# Altium schematic symbol library Electronic Devices_LIB.SchLib: 703 symbols (part 1 of 8)
Pins are listed as number, name and electrical type; pins without a type are passive.

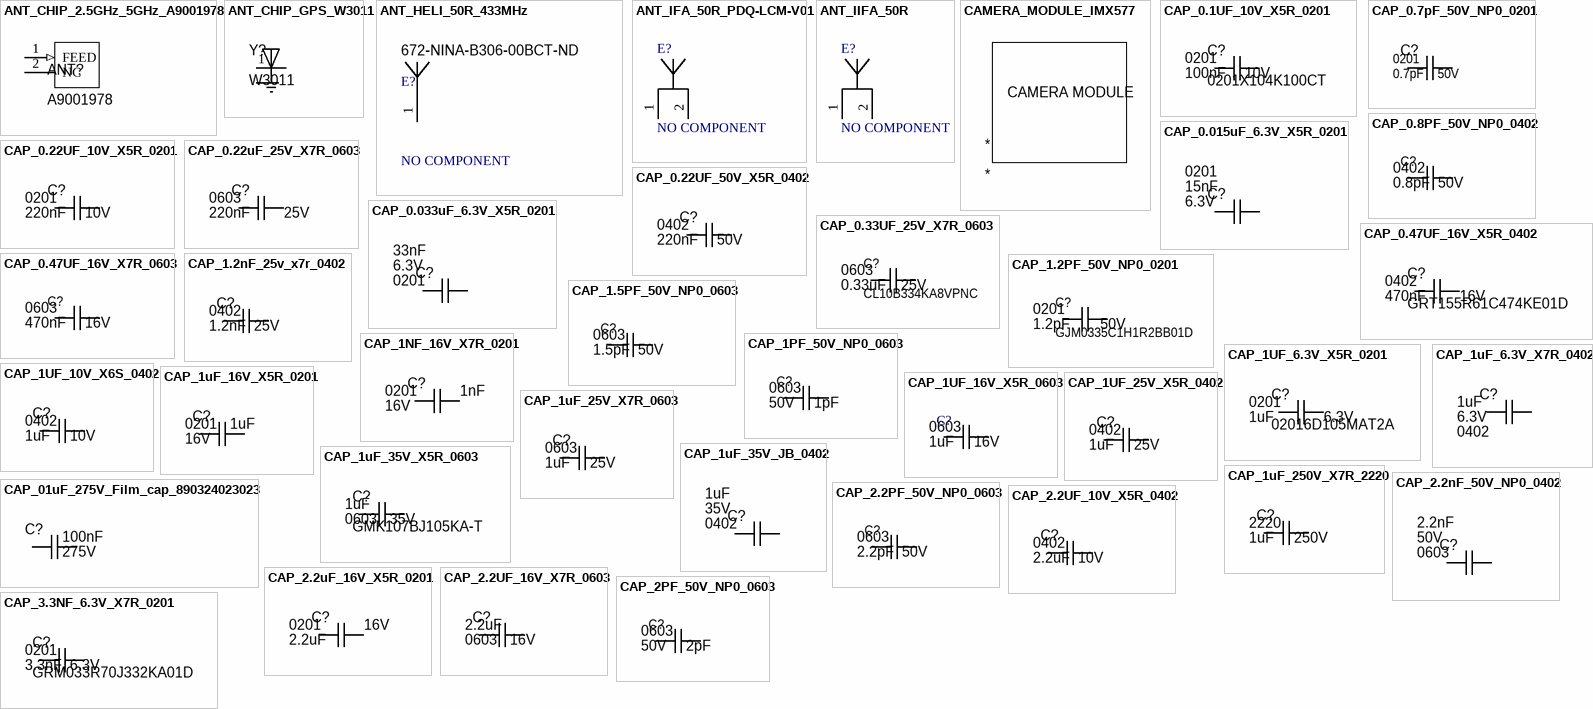
[diagram p0: symbols ANT_CHIP_2.5GHz_5GHz_A9001978 to CAP_3.3NF_6.3V_X7R_0201]

## ANT_CHIP_2.5GHz_5GHz_A9001978
designator ANT?, comment A9001978
Automotive Ultra-small Uwb Or Bl; Manufacturer: Kyocera AVX; Supplier 1: Digikey; Manufacturer Part Number: A9001978; RoHS: No; Category: Uncategorized; Stock 1: 3990; Pricing 1: 1=1.53, 10=1.367, 25=1.2976, 100=1.066, 250=0.99652, 500=0.88064, 1000=0.69525, 2500=0.6489 (USD); Supplier Part Number 1: 478-A9001978CT-ND
footprint ANTENNA_CHIP_ANTC1006X50N (1x0.55 mm)
pins: 1 FEED (in), 2 NC

## ANT_CHIP_GPS_W3011
designator Y?, comment W3011
Antenna Ceramic 3.4dB Gain 1585.42MHz 2-Pin CSMD; Manufacturer: Pulse; Frequency: 1.57542GHz; Impedance: 50R; Number of Bands: 1; Return Loss: -12dB; Max Frequency: 1.58542GHz; Min Frequency: 1.56542GHz; Supplier 1: Digikey; Manufacturer Part Number: W3011; RoHS: Yes; Category: RF Antennas; Stock 1: 8689; Pricing 1: 1=2.56, 10=1.654, 25=1.4148, 100=1.1461, 250=1.01512, 500=0.93512, 1000=0.86859 (USD); Mount: Surface Mount,PCB; Packaging: Cut Tape; Package Quantity: 3000; Termination: Solder; Series: -; Height: 0.043inch; RoHS Compliant: Yes; Lead Free: Lead Free; ComponentLink1URL: https://datasheet.ciiva.com/2792/+w3011-w3011a-2792615.pdf?src-supplier=Digikey; ComponentLink1Description: https://datasheet.ciiva.com/2792/+w3011-w3011a-2792615.pdf?src-supplier=Digikey; ComponentLink2URL: https://datasheet.ciiva.com/8152/+w3011-w3011a-8152997.pdf?src-supplier=Avnet; ComponentLink2Description: https://datasheet.ciiva.com/8152/+w3011-w3011a-8152997.pdf?src-supplier=Avnet; Supplier Part Number 1: 553-2582-1-ND
footprint ANTENNA_CHIP_XDCR_W3011
pins: 1 FEED, 2 GND (power), 2 NC, 3 GND

## ANT_HELI_50R_433MHz
designator E?, comment NO COMPONENT  Supplier Part Number 4: 672-NINA-B306-00BCT-ND  (net tie, no BOM)
433MHz Alarms, ISM, Remote Control, Security Systems Helical RF Antenna 418MHz ~ 458MHz 1.9dBi Solder Through Hole ( / ANT-433-HETH); PartNumber: ANTENNA_IIFA; SymbolCreator: Altium; SymbolVersion: 2014-08-20; Manufacturer: N/A; CompType: Antenna; MountType: N/A; ComponentLink1Description: Datasheet Link; ComponentLink1URL: http://www.ti.com/lit/an/swra117d/swra117d.pdf; PackageReference: PCB Antenna, 2-Leads; Publisher: Texas Instruments; LatestRevisionDate: 2015-03-27; Supplier 4: Digikey
footprint ANTENNA_HELICOIDAL-MICRO-TRACE_433MHz (Micro Helical Trace Antenna, 433MHz, Must have matching network to achieve 50R)
pins: 1 FEED

## ANT_IFA_50R_PDQ-LCM-V01
designator E?, comment NO COMPONENT  (net tie, no BOM)
PCB Antenna, IFA, 50R, PDQ Spirit LCM, v01, There is nothing to buy or mount.; PartNumber: ANTENNA_IIFA; SymbolCreator: Altium; SymbolVersion: 2014-08-20; Manufacturer: N/A; CompType: Antenna; MountType: N/A; ComponentLink1Description: Datasheet Link; ComponentLink1URL: http://www.ti.com/lit/an/swra117d/swra117d.pdf; PackageReference: PCB Antenna, 2-Leads; Publisher: Texas Instruments; LatestRevisionDate: 2015-03-27
footprint ANTENNA_IFA_EXPOSED_PDQ-LCM-V01 (Straight IFA, exposed Cu, PDQ Spirit LCM, v01)
footprint ANTENNA_IFA_180_EXPOSED_PDQ-LCM-V01 (Straight IFA, exposed Cu, PDQ Spirit LCM, v01, Flipped 180 deg)
pins: 1 FEED, 2 GND

## ANT_IIFA_50R
designator E?, comment NO COMPONENT  (net tie, no BOM)
PCB Antenna, IIFA, 50R, There is nothing to buy or mount.; PartNumber: ANTENNA_IIFA; SymbolCreator: Altium; SymbolVersion: 2014-08-20; Manufacturer: N/A; CompType: Antenna; MountType: N/A; ComponentLink1Description: Datasheet Link; ComponentLink1URL: http://www.ti.com/lit/an/swra117d/swra117d.pdf; PackageReference: PCB Antenna, 2-Leads; Publisher: Texas Instruments; LatestRevisionDate: 2015-03-27
footprint ANTENNA_IIFA
footprint ANTENNA_IIFA_180 (IIFA Antenna mirrored 180 degrees)
footprint ANTENNA_IIFA_180_EXPOSED (IIFA Antenna mirrored 180 degrees)
footprint ANTENNA_IIFA_EXPOSED
footprint ANTENNA_IIFA_TEST
pins: 1, 2

## CAMERA_MODULE_IMX577
designator *

## CAP_0.1UF_10V_X5R_0201
designator C?, comment 0201X104K100CT  Capacitance: 100nF  Voltage Rating: 10V  Case/Package: 0201
0201 0.1 uF 10 V ±10 %Tolerance X5R Surface Mount Multilayer Ceramic Capacitor; Manufacturer: Walsin Technologies; Tolerance: 10%; Dielectric: 1537DielectricType; Supplier 1: Digi-Key; Manufacturer Part Number: 0201X104K100CT; RoHS: Yes; Category: Ceramic Capacitors; Stock 1: 1142023; Pricing 1: 1=0.1, 10=0.028, 50=0.0164, 100=0.0127, 500=0.00954, 1000=0.0075, 2500=0.00682, 5000=0.00627 (USD); Mount: Surface Mount; Case Code (Imperial): 0201; Case Code (Metric): 0603; Min Operating Temperature: -55°C; Max Operating Temperature: 85°C; Packaging: Cut Tape; Series: -; Voltage Rating (DC): 10V; RoHS Compliant: Yes; Lead Free: 5697LeadFree; ComponentLink1URL: http://www.passivecomponent.com/indexsea/0201X104K100CT-IL.pdf?src-supplier=Digi-Key; ComponentLink1Description: http://www.passivecomponent.com/indexsea/0201X104K100CT-IL.pdf?src-supplier=Digi-Key; ComponentLink2URL: http://www.passivecomponent.com/wp-content/uploads/2018/10/MLCC.pdf?src-supplier=Digi-Key; ComponentLink2Description: http://www.passivecomponent.com/wp-content/uploads/2018/10/MLCC.pdf?src-supplier=Digi-Key; ComponentLink3URL: http://datasheet.octopart.com/0201X104K100CT-Walsin-Technologies-datasheet-136037192.pdf?src-supplier=Rs; ComponentLink3Description: http://datasheet.octopart.com/0201X104K100CT-Walsin-Technologies-datasheet-136037192.pdf?src-supplier=Rs; Supplier Part Number 1: 1292-1160-6-ND
footprint CAP_0201_CAPC0603X03N (Chip Capacitor, 2-Leads, Body 0.60x0.30mm, IPC Medium Density)
pins: 1, 2

## CAP_0.7pF_50V_NP0_0201
designator C?, comment Capacitance: 0.7pF  Case/Packcage: 0201  Voltage Rating: 50V  (hidden comment: CQ0201ARNPO9BNR70)
Cap Cer SMD 0201 0.7pF Â± 0.05 pF 50V C0G T&R; Manufacturer: Yageo; Supplier 1: Digikey; Manufacturer Part Number: CQ0201ARNPO9BNR70; RoHS: Yes; Category: Uncategorized; Stock 1: 102514; Pricing 1: 1=0.17, 10=0.113, 50=0.0676, 100=0.0532, 500=0.03928, 1000=0.03252, 2500=0.03026, 5000=0.02769 (USD); Supplier Part Number 1: 13-CQ0201ARNPO9BNR70CT-ND
footprint CAP_0201_CAPC0603X03N (Chip Capacitor, 2-Leads, Body 0.60x0.30mm, IPC Medium Density)
pins: 1, 2

## CAP_0.8PF_50V_NP0_0402
designator C?, comment Voltage Rating: 50V  Capacitance: 0.8pF  Case/Package: 0402  (hidden comment: GCM1555C1HR80BA16D)
Cap, Aec-Q200, 0.8Pf, 50V, Mlcc, 0402 Rohs Compliant: Yes; Manufacturer: Murata; Dielectric: C0G; Supplier 1: Digi-Key; Manufacturer Part Number: GCM1555C1HR80BA16D; RoHS: Yes; Category: Ceramic Capacitors; Stock 1: 32321; Pricing 1: 1=0.1, 10=0.07, 50=0.0396, 100=0.0329, 500=0.02304, 1000=0.01907, 2500=0.01775, 5000=0.01624 (USD); Mount: Surface Mount; Case Code (Imperial): 0402; Case Code (Metric): 1005; Weight: 2.3E-05oz; Min Operating Temperature: -55°C; Max Operating Temperature: 125°C; Packaging: Tape and Reel; Termination: SMD/SMT; Voltage Rating (DC): 50V; Package Quantity: 10000; Series: GCM; Length: 1mm; Width: 0.5mm; Height: 0.5mm; Ratings: AEC-Q200; RoHS Compliant: Yes; ComponentLink1URL: http://www.mouser.com/ds/2/281/c03e-516224.pdf?src-supplier=Mouser; ComponentLink1Description: http://www.mouser.com/ds/2/281/c03e-516224.pdf?src-supplier=Mouser; ComponentLink2URL: http://www.murata.com/~/media/webrenewal/support/library/catalog/products/capacitor/mlcc/c03e.ashx?src-supplier=Digi-Key; ComponentLink2Description: http://www.murata.com/~/media/webrenewal/support/library/catalog/products/capacitor/mlcc/c03e.ashx?src-supplier=Digi-Key; Supplier Part Number 1: 490-GCM1555C1HR80BA16DCT-ND
footprint CAP_0402_CAPC1005X05N (Chip Capacitor, 2-Leads, Body 1.00x0.50mm, IPC Medium Density)
pins: 1, 2

## CAP_0.015uF_6.3V_X5R_0201
designator C?, comment Voltage Rating: 6.3V  Capacitance: 15nF  Case/Package: 0201  (hidden comment: GRM033R60J153KE01D)
0201 15 nF 6.3 V ±10% Tolerance X5R SMT Multilayer Ceramic Capacitor; Manufacturer: Murata; Supplier 1: Mouser; Manufacturer Part Number: GRM033R60J153KE01D; RoHS: Yes; Category: Ceramic Capacitors; Stock 1: 84989; Pricing 1: 1=0.1, 10=0.014, 50=0.014, 100=0.007, 1000=0.005, 10000=0.005 (USD); Mount: Surface Mount; Case Code (Metric): 0603; Case Code (Imperial): 0201; Material: Ceramic; Min Operating Temperature: -55°C; Max Operating Temperature: 85°C; Package Quantity: 1; Tolerance: 10%; Packaging: Tape and Reel; Voltage Rating (DC): 6.3V; Dielectric: X5R; Termination: SMD/SMT; Series: GRM; Construction: Flat; Length: 0.6mm; Width: 0.012inch; Height: 0.3mm; Thickness: 0.013inch; Depth: 0.3mm; Radiation Hardening: No; Lead Free: Lead Free; RoHS Compliant: Yes; ComponentLink1URL: https://datasheet.ciiva.com/130/product-130817.pdf?src-supplier=Digikey; ComponentLink1Description: https://datasheet.ciiva.com/130/product-130817.pdf?src-supplier=Digikey; ComponentLink2URL: https://datasheet.ciiva.com/18184/getdatasheetpartid-306886-18184038.pdf?src-supplier=Verical; ComponentLink2Description: https://datasheet.ciiva.com/18184/getdatasheetpartid-306886-18184038.pdf?src-supplier=Verical; ComponentLink3URL: https://datasheet.ciiva.com/29199/455637-da-01-en-vs-kondensator-0201-29199258.pdf?src-supplier=Conrad; ComponentLink3Description: https://datasheet.ciiva.com/29199/455637-da-01-en-vs-kondensator-0201-29199258.pdf?src-supplier=Conrad; ComponentLink4URL: https://datasheet.ciiva.com/130/grm033r60j153ke01-01-130818.pdf?src-supplier=Digikey; ComponentLink4Description: https://datasheet.ciiva.com/130/grm033r60j153ke01-01-130818.pdf?src-supplier=Digikey; ComponentLink5URL: https://datasheet.ciiva.com/130/grm033r60j153ke01-01-130819.pdf?src-supplier=Digikey; ComponentLink5Description: https://datasheet.ciiva.com/130/grm033r60j153ke01-01-130819.pdf?src-supplier=Digikey; ComponentLink6URL: https://datasheet.ciiva.com/11619/product-11619495.pdf?src-supplier=Avnet; ComponentLink6Description: https://datasheet.ciiva.com/11619/product-11619495.pdf?src-supplier=Avnet; Supplier Part Number 1: 81-GRM033R60J153KE1D
footprint CAP_0201_CAPC0603X03N (Chip Capacitor, 2-Leads, Body 0.60x0.30mm, IPC Medium Density)
pins: 1, 2

## CAP_0.22UF_10V_X5R_0201
designator C?, comment Voltage Rating (DC): 10V  Capacitance: 220nF  Case/Package: 0201  (hidden comment: LMK063BJ224MP-F)
Multilayer Ceramic Capacitors (High dielectric type), 10V, 0.22 uF, ± 20 %, 0201, X5R, RoHS; Manufacturer: Taiyo Yuden; Material: 4241ConductorMaterial; Tolerance: 20%; Supplier 1: Digikey; Manufacturer Part Number: LMK063BJ224MP-F; RoHS: Yes; Category: Ceramic Capacitors; Stock 1: 6053224; Pricing 1: 1=0.12, 10=0.08, 50=0.0478, 100=0.0375, 500=0.02772, 1000=0.02295, 2500=0.02136, 5000=0.01954 (USD); Mount: Surface Mount; Case Code (Metric): 0603; Case Code (Imperial): 0201; Min Operating Temperature: -55°C; Max Operating Temperature: 85°C; Voltage Rating: 10V; Packaging: Tape and Reel; Package Quantity: 15000; Dielectric: X5R; Termination: SMD/SMT; Voltage: 10V; Series: M; Construction: Flat; Length: 0.6mm; Width: 0.3mm; Height: 0.3mm; Depth: 0.3mm; Radiation Hardening: No; Halogen Free: Halogen Free; RoHS Compliant: Yes; Reach SVHC Compliant: Unknown; ComponentLink1URL: https://datasheet.ciiva.com/134/lmk063bj224mp-f-ss-134995.pdf?src-supplier=Digikey; ComponentLink1Description: https://datasheet.ciiva.com/134/lmk063bj224mp-f-ss-134995.pdf?src-supplier=Digikey; ComponentLink2URL: https://datasheet.ciiva.com/11464/lmk063bj224mp-f-ss-11464053.pdf?src-supplier=Avnet; ComponentLink2Description: https://datasheet.ciiva.com/11464/lmk063bj224mp-f-ss-11464053.pdf?src-supplier=Avnet; ComponentLink3URL: https://datasheet.ciiva.com/15921/1589lmk063bj224mp-f-15921250.pdf?src-supplier=Onlinecomponents.com; ComponentLink3Description: https://datasheet.ciiva.com/15921/1589lmk063bj224mp-f-15921250.pdf?src-supplier=Onlinecomponents.com; ComponentLink4URL: https://datasheet.ciiva.com/26872/getdatasheetpartid-639019-26872592.pdf?src-supplier=Verical; ComponentLink4Description: https://datasheet.ciiva.com/26872/getdatasheetpartid-639019-26872592.pdf?src-supplier=Verical; ComponentLink5URL: https://datasheet.ciiva.com/30243/100lmk063bj224mp-f-30243150.pdf?src-supplier=Onlinecomponents.com; ComponentLink5Description: https://datasheet.ciiva.com/30243/100lmk063bj224mp-f-30243150.pdf?src-supplier=Onlinecomponents.com; ComponentLink6URL: https://datasheet.ciiva.com/28645/746258-28645141.pdf?src-supplier=Element14; ComponentLink6Description: https://datasheet.ciiva.com/28645/746258-28645141.pdf?src-supplier=Element14; ComponentLink7URL: https://datasheet.ciiva.com/5422/mlcc-all-e-541559-5422365.pdf?src-supplier=Mouser; ComponentLink7Description: https://datasheet.ciiva.com/5422/mlcc-all-e-541559-5422365.pdf?src-supplier=Mouser; Supplier Part Number 1: 587-2483-1-ND
footprint CAP_0201_CAPC0603X03N (Chip Capacitor, 2-Leads, Body 0.60x0.30mm, IPC Medium Density)
pins: 1, 2

## CAP_0.22uF_25V_X7R_0603
designator C?, comment Case/Package: 0603  Voltage Rating: 25V  Capacitance: 220nF  (hidden comment: GRM188R71E224KA88D)
Multilayer Ceramic Capacitor, 0.22 uF, 25 V, ± 10%, X7R, 0603 [1608 Metric]; Manufacturer: Murata; Voltage: 50V; Supplier 1: Mouser; Manufacturer Part Number: GRM188R71E224KA88D; RoHS: Yes; Category: Ceramic Capacitors; Stock 1: 86605; Pricing 1: 1=0.1, 10=0.036, 50=0.036, 100=0.021, 1000=0.019, 10000=0.012 (USD); Mount: Surface Mount; Number of Pins: 2; Case Code (Imperial): 0603; Case Code (Metric): 1608; Material: Ceramic; Min Operating Temperature: -55°C; Max Operating Temperature: 125°C; Tolerance: 10%; Dielectric: X7R; Voltage Rating (DC): 25V; Packaging: Tape and Reel; Package Quantity: 1; Termination: SMD/SMT; Series: GRM; Construction: Flat; Length: 1.6mm; Width: 0.031inch; Height: 0.8mm; Thickness: 0.035inch; Depth: 0.8mm; Radiation Hardening: No; Reach SVHC Compliant: No; RoHS Compliant: Yes; Lead Free: 5697LeadFree; ComponentLink1URL: https://datasheet.ciiva.com/133/grm188r71e224ka88-01-133883.pdf?src-supplier=Digi-Key; ComponentLink1Description: https://datasheet.ciiva.com/133/grm188r71e224ka88-01-133883.pdf?src-supplier=Digi-Key; ComponentLink2URL: https://datasheet.ciiva.com/133/grm188r71e224ka88-01-133884.pdf?src-supplier=Digi-Key; ComponentLink2Description: https://datasheet.ciiva.com/133/grm188r71e224ka88-01-133884.pdf?src-supplier=Digi-Key; ComponentLink3URL: https://datasheet.ciiva.com/5411/product-5411362.pdf?src-supplier=Mouser; ComponentLink3Description: https://datasheet.ciiva.com/5411/product-5411362.pdf?src-supplier=Mouser; ComponentLink4URL: https://datasheet.ciiva.com/11786/0900766b807a1cab-11786308.pdf?src-supplier=Rs; ComponentLink4Description: https://datasheet.ciiva.com/11786/0900766b807a1cab-11786308.pdf?src-supplier=Rs; ComponentLink5URL: https://datasheet.ciiva.com/6068/1784408-6068393.pdf?src-supplier=Farnell; ComponentLink5Description: https://datasheet.ciiva.com/6068/1784408-6068393.pdf?src-supplier=Farnell; ComponentLink6URL: https://datasheet.ciiva.com/3777/1531grm188r71e224ka8823-3777688.pdf?src-supplier=Arrow+Electronics; ComponentLink6Description: https://datasheet.ciiva.com/3777/1531grm188r71e224ka8823-3777688.pdf?src-supplier=Arrow+Electronics; ComponentLink7URL: https://datasheet.ciiva.com/29202/451619-da-01-en-vs-kondensator-0603-29202002.pdf?src-supplier=Conrad; ComponentLink7Description: https://datasheet.ciiva.com/29202/451619-da-01-en-vs-kondensator-0603-29202002.pdf?src-supplier=Conrad; ComponentLink8URL: https://datasheet.ciiva.com/48436/nmgrm-data-en-48436687.pdf?src-supplier=Distrelec; ComponentLink8Description: https://datasheet.ciiva.com/48436/nmgrm-data-en-48436687.pdf?src-supplier=Distrelec; ComponentLink9URL: https://datasheet.ciiva.com/14116/nmgrm-data-en-14116629.pdf?src-supplier=Distrelec; ComponentLink9Description: https://datasheet.ciiva.com/14116/nmgrm-data-en-14116629.pdf?src-supplier=Distrelec; ComponentLink10URL: https://datasheet.ciiva.com/16425/product-16425866.pdf?src-supplier=Future+Electronics; ComponentLink10Description: https://datasheet.ciiva.com/16425/product-16425866.pdf?src-supplier=Future+Electronics; ComponentLink11URL: https://datasheet.ciiva.com/22703/1784408-22703338.pdf?src-supplier=Element14; ComponentLink11Description: https://datasheet.ciiva.com/22703/1784408-22703338.pdf?src-supplier=Element14; ComponentLink12URL: https://datasheet.ciiva.com/7937/1784408-7937645.pdf?src-supplier=Element14; ComponentLink12Description: https://datasheet.ciiva.com/7937/1784408-7937645.pdf?src-supplier=Element14; Supplier Part Number 1: 81-GRM188R71E224KA88
footprint CAP_0603_CAPC1608X08N (Chip Capacitor, 2-Leads, Body 1.60x0.80mm, IPC Medium Density)
pins: 1, 2

## CAP_0.22UF_50V_X5R_0402
designator C?, comment Case/Package: 0402  Voltage Rating (DC): 50V  Capacitance: 220nF  (hidden comment: GRM155R61H224KE01W)
Multilayer Ceramic Capacitor, 0.22 uF, 50 VDC, ± 10%, X5R, 0402 [1005 Metric]; Manufacturer: Murata; Material: 4241ConductorMaterial; Dielectric: 1537DielectricType; Supplier 1: Digi-Key; Manufacturer Part Number: GRM155R61H224KE01W; RoHS: No; Category: Ceramic Capacitors; Stock 1: 74638; Pricing 1: 1=0.1, 10=0.048, 50=0.0272, 100=0.0212, 500=0.01592, 1000=0.01251, 2500=0.01138, 5000=0.01046 (USD); Min Operating Temperature: -55°C; Max Operating Temperature: 85°C; Voltage Rating: 50V; Length: 1mm; Width: 500um; Height: 550um; Thickness: 500um; Supplier Part Number 1: 490-GRM155R61H224KE01WCT-ND
footprint CAP_0402_CAPC1005X05N (Chip Capacitor, 2-Leads, Body 1.00x0.50mm, IPC Medium Density)
pins: 1, 2

## CAP_0.033uF_6.3V_X5R_0201
designator C?, comment Voltage Rating: 6.3V  Capacitance: 33nF  Case/Package: 0201  (hidden comment: GRM033R60J333KE01D)
Multilayer Ceramic Capacitor, 0.033 uF, 6.3 V, ± 10%, X5R, 0201 [0603 Metric]; Manufacturer: Murata; Dissipation Factor: 0.1%; Supplier 1: Mouser; Manufacturer Part Number: GRM033R60J333KE01D; RoHS: Yes; Category: Ceramic Capacitors; Stock 1: 164761; Pricing 1: 1=0.1, 10=0.017, 50=0.017, 100=0.011, 1000=0.01, 10000=0.008 (USD); Mount: Surface Mount; Case Code (Metric): 0603; Case Code (Imperial): 0201; Material: Ceramic; Min Operating Temperature: -55°C; Max Operating Temperature: 85°C; Tolerance: 10%; Packaging: Tape and Reel; Voltage Rating (DC): 6.3V; Package Quantity: 1; Dielectric: X5R; Termination: SMD/SMT; Voltage: 6.3V; Series: GRM; Construction: Flat; Length: 0.6mm; Width: 0.012inch; Height: 0.3mm; Thickness: 0.013inch; Depth: 0.3mm; Radiation Hardening: No; Reach SVHC Compliant: No; Lead Free: Lead Free; RoHS Compliant: Yes; ComponentLink1URL: https://datasheet.ciiva.com/131/product-131104.pdf?src-supplier=Digikey; ComponentLink1Description: https://datasheet.ciiva.com/131/product-131104.pdf?src-supplier=Digikey; ComponentLink2URL: https://datasheet.ciiva.com/18184/getdatasheetpartid-220776-18184045.pdf?src-supplier=Verical; ComponentLink2Description: https://datasheet.ciiva.com/18184/getdatasheetpartid-220776-18184045.pdf?src-supplier=Verical; ComponentLink3URL: https://datasheet.ciiva.com/29199/455665-da-01-en-vs-kondensator-0201-29199269.pdf?src-supplier=Conrad; ComponentLink3Description: https://datasheet.ciiva.com/29199/455665-da-01-en-vs-kondensator-0201-29199269.pdf?src-supplier=Conrad; ComponentLink4URL: https://datasheet.ciiva.com/11605/product-11605453.pdf?src-supplier=Avnet; ComponentLink4Description: https://datasheet.ciiva.com/11605/product-11605453.pdf?src-supplier=Avnet; ComponentLink5URL: https://datasheet.ciiva.com/16199/product-16199350.pdf?src-supplier=Future+Electronics; ComponentLink5Description: https://datasheet.ciiva.com/16199/product-16199350.pdf?src-supplier=Future+Electronics; Supplier Part Number 1: 81-GRM033R60J333KE01
footprint CAP_0201_CAPC0603X03N (Chip Capacitor, 2-Leads, Body 0.60x0.30mm, IPC Medium Density)
pins: 1, 2

## CAP_0.33UF_25V_X7R_0603
designator C?, comment CL10B334KA8VPNC  Volatage rating: 25V  Capacitance: 0.33uF  Case/package: 0603
Cap Ceramic 0.33uF 25V X7R 10% Pad SMD 0603 125C Automotive T/R; Manufacturer: Samsung; Supplier 1: Digi-Key; Manufacturer Part Number: CL10B334KA8VPNC; RoHS: Yes; Category: Ceramic Capacitors; Stock 1: 213390; Pricing 1: 1=0.14, 10=0.101, 50=0.0574, 100=0.0475, 500=0.03334, 1000=0.02759 (USD); RoHS Compliant: Yes; ComponentLink1URL: http://www.samsungsem.com/servlet/FileDownload?type=spec&file=CL10B334KA8VPNC.pdf&src-supplier=Avnet; ComponentLink1Description: http://www.samsungsem.com/servlet/FileDownload?type=spec&file=CL10B334KA8VPNC.pdf&src-supplier=Avnet; Supplier Part Number 1: 1276-CL10B334KA8VPNCDKR-ND
footprint CAP_0603_CAPC1608X08N (Chip Capacitor, 2-Leads, Body 1.60x0.80mm, IPC Medium Density)
pins: 1, 2

## CAP_0.47UF_16V_X5R_0402
designator C?, comment GRT155R61C474KE01D  Voltage Rating: 16V  Capacitance: 470nF  Case/Package: 0402
0402 0.47 uF 16 V ±10 % Tolerance X5R SMT Multilayer Ceramic Capacitor; Manufacturer: Murata; Tolerance: 10%; Supplier 1: Digi-Key; Manufacturer Part Number: GRT155R61C474KE01D; RoHS: Yes; Category: Ceramic Capacitors; Stock 1: 1892752; Pricing 1: 1=0.4, 10=0.27, 50=0.215, 100=0.1775, 500=0.13868, 1000=0.11788, 2500=0.11095, 5000=0.10401 (USD); Mount: Surface Mount; Case Code (Metric): 1005; Case Code (Imperial): 0402; Min Operating Temperature: -55°C; Max Operating Temperature: 85°C; Packaging: Cut Tape; Series: GRT; Length: 0.039inch; Width: 0.02inch; Thickness: 0.022inch; Ratings: AEC-Q200; RoHS Compliant: Yes; ComponentLink1URL: http://search.murata.co.jp/Ceramy/image/img/A01X/G101/ENG/GRT155R61C474KE01-01.pdf?src-supplier=Digi-Key; ComponentLink1Description: http://search.murata.co.jp/Ceramy/image/img/A01X/G101/ENG/GRT155R61C474KE01-01.pdf?src-supplier=Digi-Key; ComponentLink2URL: https://datasheet.octopart.com/GRT155R61C474KE01D-Murata-datasheet-149523552.pdf?src-supplier=Newark; ComponentLink2Description: https://datasheet.octopart.com/GRT155R61C474KE01D-Murata-datasheet-149523552.pdf?src-supplier=Newark; ComponentLink3URL: https://datasheet.octopart.com/GRT155R61C474KE01D-Murata-datasheet-82944871.pdf?src-supplier=Future+Electronics; ComponentLink3Description: https://datasheet.octopart.com/GRT155R61C474KE01D-Murata-datasheet-82944871.pdf?src-supplier=Future+Electronics; ComponentLink4URL: https://datasheet.octopart.com/GRT155R61C474KE01D-Murata-datasheet-165579666.pdf?src-supplier=TME; ComponentLink4Description: https://datasheet.octopart.com/GRT155R61C474KE01D-Murata-datasheet-165579666.pdf?src-supplier=TME; Supplier Part Number 1: 490-12261-6-ND
footprint CAP_0402_CAPC1005X05N (Chip Capacitor, 2-Leads, Body 1.00x0.50mm, IPC Medium Density)
pins: 1, 2

## CAP_0.47UF_16V_X7R_0603
designator C?, comment Voltage: 16V  Capacitance: 470nF  Case/Package: 0603  (hidden comment: CL10B474KO8NNNC)
Multilayer Ceramic Capacitor, 0.47 uF, 16 V, ± 10%, X7R, 0603 [1608 Metric]; Manufacturer: Samsung; Supplier 1: Digi-Key; Manufacturer Part Number: CL10B474KO8NNNC; RoHS: Yes; Category: Ceramic Capacitors; Stock 1: 68963; Pricing 1: 1=0.1, 10=0.047, 50=0.0254, 100=0.0208, 500=0.01484, 1000=0.01167 (USD); Mount: Surface Mount; Case Code (Metric): 1608; Case Code (Imperial): 0603; Material: Ceramic; Min Operating Temperature: -55°C; Max Operating Temperature: 125°C; Packaging: Tape and Reel; Series: CL; Tolerance: 10%; Voltage Rating: 16V; Package Quantity: 1; Dielectric: X7R; Construction: Flat; Voltage Rating (DC): 16V; Length: 1.6mm; Width: 0.031inch; Height: 0.8mm; Depth: 0.8mm; Thickness: 0.035inch; Radiation Hardening: No; RoHS Compliant: Yes; Lead Free: Lead Free; ComponentLink1URL: https://datasheet.ciiva.com/15195/getdatasheetpartid-354055-15195767.pdf?src-supplier=Verical; ComponentLink1Description: https://datasheet.ciiva.com/15195/getdatasheetpartid-354055-15195767.pdf?src-supplier=Verical; ComponentLink2URL: https://datasheet.ciiva.com/29198/456266-da-01-en-vs-kondensator-0603-29198948.pdf?src-supplier=Conrad; ComponentLink2Description: https://datasheet.ciiva.com/29198/456266-da-01-en-vs-kondensator-0603-29198948.pdf?src-supplier=Conrad; ComponentLink3URL: https://datasheet.ciiva.com/26310/mlcc-catalogdownload2013-eng-26310271.pdf?src-supplier=Distrelec; ComponentLink3Description: https://datasheet.ciiva.com/26310/mlcc-catalogdownload2013-eng-26310271.pdf?src-supplier=Distrelec; ComponentLink4URL: https://datasheet.ciiva.com/16311/clseries-16311528.pdf?src-supplier=Future+Electronics; ComponentLink4Description: https://datasheet.ciiva.com/16311/clseries-16311528.pdf?src-supplier=Future+Electronics; Supplier Part Number 1: 1276-1062-1-ND
footprint CAP_0603_CAPC1608X08N (Chip Capacitor, 2-Leads, Body 1.60x0.80mm, IPC Medium Density)
pins: 1, 2

## CAP_1.2nF_25v_x7r_0402
designator C?, comment Capacitance: 1.2nF  Voltage Rating (DC): 25V  Case/Package: 0402  (hidden comment: C0402C122K3RAC7867)
Cap Ceramic 0.0012uF 25V X7R 10% SMD 0402 125°C Paper T/R; Manufacturer: KEMET; Supplier 1: Digi-Key; Manufacturer Part Number: C0402C122K3RAC7867; RoHS: Yes; Category: Ceramic Capacitors; Stock 1: 38920; Pricing 1: 1=0.32, 10=0.211, 50=0.1556, 100=0.1267, 500=0.1, 1000=0.08445, 2500=0.08001, 5000=0.07556 (USD); Mount: Surface Mount; Dielectric Material: Ceramic; Contact Plating: Tin,Matte; Min Operating Temperature: -55°C; Max Operating Temperature: 125°C; Tolerance: 10%; Construction: Flat; Length: 1mm; RoHS Compliant: Yes; ComponentLink1URL: https://api.kemet.com/component-edge/download/datasheet/C0402C122K3RACTU.pdf?src-supplier=Digi-Key; ComponentLink1Description: https://api.kemet.com/component-edge/download/datasheet/C0402C122K3RACTU.pdf?src-supplier=Digi-Key; ComponentLink2URL: http://capacitoredge.kemet.com/capedge2/DataSheet?pn=C0402C122K3RAC7867&src-supplier=Avnet; ComponentLink2Description: http://capacitoredge.kemet.com/capedge2/DataSheet?pn=C0402C122K3RAC7867&src-supplier=Avnet; ComponentLink3URL: http://capacitoredge.kemet.com/capedge2/DataSheet?pn=C0402C122K3RAC7867; ComponentLink3Description: http://capacitoredge.kemet.com/capedge2/DataSheet?pn=C0402C122K3RAC7867; Supplier Part Number 1: 399-14419-1-ND
footprint CAP_0402_CAPC1005X05N (Chip Capacitor, 2-Leads, Body 1.00x0.50mm, IPC Medium Density)
pins: 1, 2

## CAP_1.2PF_50V_NP0_0201
designator C?, comment GJM0335C1H1R2BB01D  Capacitance: 1.2pF  Voltage Rating: 50V  Case/Package: 0201
Cap Ceramic 1.2pF 50V C0G 0.1pF Pad SMD 0201 125C T/R; Manufacturer: Murata; Supplier 1: Digi-Key; Manufacturer Part Number: GJM0335C1H1R2BB01D; RoHS: Yes; Category: Ceramic Capacitors; Stock 1: 32496; Pricing 1: 1=0.1, 10=0.055, 50=0.03, 100=0.0245, 500=0.01752, 1000=0.01376, 2500=0.01251, 5000=0.01151 (USD); Mount: Surface Mount; Min Operating Temperature: -55°C; Max Operating Temperature: 125°C; Series: GJM; RoHS Compliant: Yes; ComponentLink1URL: https://search.murata.co.jp/Ceramy/image/img/A01X/G101/ENG/GJM0335C1H1R2BB01-01.pdf?src-supplier=Digi-Key; ComponentLink1Description: https://search.murata.co.jp/Ceramy/image/img/A01X/G101/ENG/GJM0335C1H1R2BB01-01.pdf?src-supplier=Digi-Key; ComponentLink2URL: https://datasheet.octopart.com/GJM0335C1H1R2BB01D-Murata-datasheet-165579666.pdf?src-supplier=TME; ComponentLink2Description: https://datasheet.octopart.com/GJM0335C1H1R2BB01D-Murata-datasheet-165579666.pdf?src-supplier=TME; Supplier Part Number 1: 490-17153-6-ND
footprint CAP_0201_CAPC0603X03N (Chip Capacitor, 2-Leads, Body 0.60x0.30mm, IPC Medium Density)
pins: 1, 2

## CAP_1.5PF_50V_NP0_0603
designator C?, comment Capacitance: 1.5pF  Voltage Rating: 50V  Case/Package: 0603  (hidden comment: CC0603BRNPO9BN1R5)
Surface Mount Ceramic Multilayer Capacitor 1.5pF 0.1pF C0G 50V 0603 Paper T/R; Manufacturer: Yageo; Supplier 1: Digi-Key; Manufacturer Part Number: CC0603BRNPO9BN1R5; RoHS: Yes; Category: Ceramic Capacitors; Stock 1: 55022; Pricing 1: 1=0.1, 10=0.077, 50=0.0418, 100=0.0342, 500=0.02442, 1000=0.01919 (USD); Mount: Surface Mount; Case Code (Imperial): 0603; Case Code (Metric): 1608; Min Operating Temperature: -55°C; Max Operating Temperature: 125°C; Package Quantity: 4000; Packaging: Tape and Reel; Series: CC; Voltage Rating (DC): 50V; Dielectric: C0G; Termination: SMD/SMT; Length: 1.6mm; Width: 0.031inch; Thickness: 0.035inch; Depth: 0.8mm; Radiation Hardening: No; RoHS Compliant: Yes; Lead Free: Lead Free; ComponentLink1URL: https://datasheet.ciiva.com/11586/upy-gp-np0-16v-to-50v-8-11586538.pdf?src-supplier=Avnet; ComponentLink1Description: https://datasheet.ciiva.com/11586/upy-gp-np0-16v-to-50v-8-11586538.pdf?src-supplier=Avnet; Supplier Part Number 1: 311-1737-1-ND
footprint CAP_0603_CAPC1608X08N (Chip Capacitor, 2-Leads, Body 1.60x0.80mm, IPC Medium Density)
pins: 1, 2

## CAP_1NF_16V_X7R_0201
designator C?, comment Voltage Rating: 16V  Capacitance: 1nF  Case/Package: 0201  (hidden comment: CL03B102KO3NNNC)
Multilayer Ceramic Capacitor, 1000 pF, 16 V, ± 10%, X7R, 0201 [0603 Metric]; Manufacturer: Samsung; Supplier 1: Digikey; Manufacturer Part Number: CL03B102KO3NNNC; RoHS: Yes; Category: Ceramic Capacitors; Stock 1: 3240218; Pricing 1: 1=0.1, 10=0.052, 50=0.0314, 100=0.0246, 500=0.0182, 1000=0.01506, 2500=0.01402, 5000=0.01282 (USD); Mount: Surface Mount; Case Code (Metric): 0603; Case Code (Imperial): 0201; Material: Ceramic; Min Operating Temperature: -55°C; Max Operating Temperature: 125°C; Packaging: Tape and Reel; Tolerance: 10%; Dielectric: X7R; Voltage Rating (DC): 16V; Series: CL; Construction: Flat; Voltage: 16V; Length: 0.6mm; Height: 0.3mm; Depth: 0.3mm; Radiation Hardening: No; RoHS Compliant: Yes; ComponentLink1URL: https://datasheet.ciiva.com/15195/getdatasheetpartid-354140-15195552.pdf?src-supplier=Verical; ComponentLink1Description: https://datasheet.ciiva.com/15195/getdatasheetpartid-354140-15195552.pdf?src-supplier=Verical; Supplier Part Number 1: 1276-1342-1-ND
footprint CAP_0201_CAPC0603X03N (Chip Capacitor, 2-Leads, Body 0.60x0.30mm, IPC Medium Density)
pins: 1, 2

## CAP_1PF_50V_NP0_0603
designator C?, comment Voltage: 50V  Capacitance: 1pF  Case/Package: 0603  (hidden comment: CC0603CRNPO9BN1R0)
Cap Ceramic 1pF 50V C0G 0.25pF SMD 0603 125C T/R; Manufacturer: Yageo; Temperature Coefficient: 30ppm/°C; Insulation Resistance: 100GR; Supplier 1: Digi-Key; Manufacturer Part Number: CC0603CRNPO9BN1R0; RoHS: Yes; Category: Ceramic Capacitors; Stock 1: 264569; Pricing 1: 1=0.1, 10=0.049, 50=0.0266, 100=0.0217, 500=0.01548, 1000=0.01217 (USD); Mount: Surface Mount; Case Code (Metric): 1608; Case Code (Imperial): 0603; Weight: 7.1E-05oz; Min Operating Temperature: -55°C; Max Operating Temperature: 125°C; Dielectric: C0G; Package Quantity: 1; Voltage Rating: 50V; Packaging: Tape and Reel; Voltage Rating (DC): 50V; Termination: SMD/SMT; Series: CC; Length: 1.6mm; Width: 0.031inch; Height: 0.8mm; Thickness: 0.035inch; Depth: 0.8mm; Radiation Hardening: No; RoHS Compliant: Yes; Lead Free: Lead Free; Reach SVHC Compliant: Unknown; ComponentLink1URL: https://datasheet.ciiva.com/11786/0900766b8079c870-11786443.pdf?src-supplier=Rs; ComponentLink1Description: https://datasheet.ciiva.com/11786/0900766b8079c870-11786443.pdf?src-supplier=Rs; ComponentLink2URL: https://datasheet.ciiva.com/144/mlccorderingcode-144511.pdf?src-supplier=Digi-Key; ComponentLink2Description: https://datasheet.ciiva.com/144/mlccorderingcode-144511.pdf?src-supplier=Digi-Key; ComponentLink3URL: https://datasheet.ciiva.com/8033/1443161-8033672.pdf?src-supplier=Element14; ComponentLink3Description: https://datasheet.ciiva.com/8033/1443161-8033672.pdf?src-supplier=Element14; ComponentLink4URL: https://datasheet.ciiva.com/8033/1443161-8033675.pdf?src-supplier=Element14; ComponentLink4Description: https://datasheet.ciiva.com/8033/1443161-8033675.pdf?src-supplier=Element14; ComponentLink5URL: https://datasheet.ciiva.com/13264/upy-gp-np0-16v-to-50v-8-3714-13264860.pdf?src-supplier=Mouser; ComponentLink5Description: https://datasheet.ciiva.com/13264/upy-gp-np0-16v-to-50v-8-3714-13264860.pdf?src-supplier=Mouser; ComponentLink6URL: https://datasheet.ciiva.com/144/mlccorderingcode-144512.pdf?src-supplier=Digi-Key; ComponentLink6Description: https://datasheet.ciiva.com/144/mlccorderingcode-144512.pdf?src-supplier=Digi-Key; ComponentLink7URL: https://datasheet.ciiva.com/144/mlccorderingcode-144513.pdf?src-supplier=Digi-Key; ComponentLink7Description: https://datasheet.ciiva.com/144/mlccorderingcode-144513.pdf?src-supplier=Digi-Key; ComponentLink8URL: https://datasheet.ciiva.com/11586/upy-gp-np0-16v-to-50v-8-11586437.pdf?src-supplier=Avnet; ComponentLink8Description: https://datasheet.ciiva.com/11586/upy-gp-np0-16v-to-50v-8-11586437.pdf?src-supplier=Avnet; Supplier Part Number 1: 311-1049-1-ND
footprint CAP_0603_CAPC1608X08N (Chip Capacitor, 2-Leads, Body 1.60x0.80mm, IPC Medium Density)
pins: 1, 2

## CAP_1UF_6.3V_X5R_0201
designator C?, comment 02016D105MAT2A  Voltage Rating (DC): 6.3V  Capacitance: 1uF  Case/Package: 0201
0201 1 uF 6.3 V ±20 % Tolerance X5R Surface Mount Multilayer Ceramic Capacitor; Manufacturer: Kyocera AVX; Tolerance: 20%; Supplier 1: Mouser; Manufacturer Part Number: 02016D105MAT2A; RoHS: Yes; Category: Ceramic Capacitors; Stock 1: 1026413; Pricing 1: 1=0.1, 10=0.028, 50=0.028, 100=0.014, 1000=0.008, 10000=0.006 (USD); Mount: Surface Mount; Number of Pins: 2; Case Code (Metric): 0603; Case Code (Imperial): 0201; Min Operating Temperature: -55°C; Max Operating Temperature: 85°C; Packaging: Cut Tape; Series: -; Voltage Rating: 6.3V; Package Quantity: 1; Length: 0.024inch; Width: 0.012inch; Thickness: 0.013inch; Depth: 0.3mm; Lead Free: Lead Free; RoHS Compliant: Yes; Reach SVHC Compliant: No; ComponentLink1URL: https://datasheet.ciiva.com/6265/cx5r-6265595.pdf?src-supplier=Digi-Key; ComponentLink1Description: https://datasheet.ciiva.com/6265/cx5r-6265595.pdf?src-supplier=Digi-Key; ComponentLink2URL: https://datasheet.ciiva.com/1123/1666675-1123122.pdf?src-supplier=Element14; ComponentLink2Description: https://datasheet.ciiva.com/1123/1666675-1123122.pdf?src-supplier=Element14; ComponentLink3URL: https://datasheet.ciiva.com/14891/cx5r-14891029.pdf?src-supplier=Digi-Key; ComponentLink3Description: https://datasheet.ciiva.com/14891/cx5r-14891029.pdf?src-supplier=Digi-Key; ComponentLink4URL: https://datasheet.ciiva.com/7614/cx5r-7614682.pdf?src-supplier=Digi-Key; ComponentLink4Description: https://datasheet.ciiva.com/7614/cx5r-7614682.pdf?src-supplier=Digi-Key; ComponentLink5URL: https://datasheet.ciiva.com/14891/cx5r-14891030.pdf?src-supplier=Digi-Key; ComponentLink5Description: https://datasheet.ciiva.com/14891/cx5r-14891030.pdf?src-supplier=Digi-Key; Supplier Part Number 1: 581-02016D105MAT2A; Dielectric: X5R
footprint CAP_0201_CAPC0603X03N (Chip Capacitor, 2-Leads, Body 0.60x0.30mm, IPC Medium Density)
pins: 1, 2

## CAP_1uF_6.3V_X7R_0402
designator C?, comment Capacitance: 1uF  Voltage Rating: 6.3V  Case Code (Imperial): 0402  (hidden comment: CL05B105KQ5NQNC)
Multilayer Ceramic Capacitor, 1 uF, 6.3 V, ï¿½ 10%, X7R, 0402 [1005 Metric]; Manufacturer: Samsung; Supplier 1: Digikey; Manufacturer Part Number: CL05B105KQ5NQNC; RoHS: Yes; Category: Ceramic Capacitors; Stock 1: 242595; Pricing 1: 1=0.15, 10=0.099, 50=0.0594, 100=0.0467, 500=0.0345, 1000=0.02856, 2500=0.02658, 5000=0.02432 (USD); Mount: Surface Mount; Case/Package: 0402; Case Code (Metric): 1005; Material: Ceramic; Min Operating Temperature: -55°C; Max Operating Temperature: 125°C; Tolerance: 10%; Packaging: Tape and Reel; Package Quantity: 1; Series: CL; Length: 0.039inch; Width: 0.02inch; Thickness: 0.022inch; Depth: 0.5mm; Lead Free: Lead Free; RoHS Compliant: Yes; ComponentLink1URL: https://datasheet.ciiva.com/25797/cl05b105kq5nqnc-25797457.pdf?src-supplier=Digikey; ComponentLink1Description: https://datasheet.ciiva.com/25797/cl05b105kq5nqnc-25797457.pdf?src-supplier=Digikey; Supplier Part Number 1: 1276-1513-1-ND; Dielectric: X7R
footprint CAP_0402_CAPC1005X05N (Chip Capacitor, 2-Leads, Body 1.00x0.50mm, IPC Medium Density)
pins: 1, 2

## CAP_1UF_10V_X6S_0402
designator C?, comment Voltage Rating: 10V  Capacitance: 1uF  Case/Package: 0402  (hidden comment: GRM155C81A105KA12D)
0402 10 V 1 uF ±10% Tolerance X6S Multilayer Ceramic Capacitor; Manufacturer: Murata; Supplier 1: Digikey; Manufacturer Part Number: GRM155C81A105KA12D; RoHS: Yes; Category: Ceramic Capacitors; Stock 1: 2486564; Pricing 1: 1=0.1, 10=0.045, 50=0.026, 100=0.0202, 500=0.01518, 1000=0.01192, 2500=0.01084, 5000=0.00997 (USD); Mount: Surface Mount; Case Code (Metric): 1005; Material: Ceramic; Case Code (Imperial): 0402; Weight: 0.000212oz; Min Operating Temperature: -55°C; Max Operating Temperature: 105°C; Dielectric: X6S; Packaging: Tape and Reel; Termination: SMD/SMT; Voltage Rating (DC): 10V; Package Quantity: 10000; Series: GRM; Length: 1mm; Width: 0.5mm; Height: 0.5mm; Thickness: 0.022inch; Lead Free: Lead Free; RoHS Compliant: Yes; ComponentLink1URL: http://www.mouser.com/ds/2/281/c02e-2905.pdf?src-supplier=Mouser; ComponentLink1Description: http://www.mouser.com/ds/2/281/c02e-2905.pdf?src-supplier=Mouser; ComponentLink2URL: https://datasheet.octopart.com/GRM155C81A105KA12D-Murata-datasheet-22122223.pdf?src-supplier=Future+Electronics; ComponentLink2Description: https://datasheet.octopart.com/GRM155C81A105KA12D-Murata-datasheet-22122223.pdf?src-supplier=Future+Electronics; ComponentLink3URL: https://datasheet.octopart.com/GRM155C81A105KA12D-Murata-datasheet-149522926.pdf?src-supplier=Newark; ComponentLink3Description: https://datasheet.octopart.com/GRM155C81A105KA12D-Murata-datasheet-149522926.pdf?src-supplier=Newark; ComponentLink4URL: http://search.murata.co.jp/Ceramy/image/img/A01X/G101/ENG/GRM155C81A105KA12-01.pdf?src-supplier=Digikey; ComponentLink4Description: http://search.murata.co.jp/Ceramy/image/img/A01X/G101/ENG/GRM155C81A105KA12-01.pdf?src-supplier=Digikey; ComponentLink5URL: http://search.murata.co.jp/Ceramy/image/img/A01X/partnumbering_e_01.pdf?src-supplier=Digikey; ComponentLink5Description: http://search.murata.co.jp/Ceramy/image/img/A01X/partnumbering_e_01.pdf?src-supplier=Digikey; ComponentLink6URL: https://datasheet.octopart.com/GRM155C81A105KA12D-Murata-datasheet-165579666.pdf?src-supplier=TME; ComponentLink6Description: https://datasheet.octopart.com/GRM155C81A105KA12D-Murata-datasheet-165579666.pdf?src-supplier=TME; Supplier Part Number 1: 490-12699-6-ND; Tolerance: 10%
footprint CAP_0402_CAPC1005X05N (Chip Capacitor, 2-Leads, Body 1.00x0.50mm, IPC Medium Density)
pins: 1, 2

## CAP_1uF_16V_X5R_0201
designator C?, comment Voltage Rating: 16V  Capacitance: 1uF  Case/Package: 0201  (hidden comment: GRM033R61C105ME15D)
Multilayer Ceramic Capacitor, 1 uF, 16 V, ± 20%, X5R, 0201 [0603 Metric]; Manufacturer: Murata; Supplier 1: Digikey; Manufacturer Part Number: GRM033R61C105ME15D; RoHS: No; Category: Ceramic Capacitors; Stock 1: 67824; Pricing 1: 1=0.16, 10=0.105, 50=0.0628, 100=0.0493, 500=0.03644, 1000=0.03017, 2500=0.02808, 5000=0.02569 (USD); Material: Ceramic; Min Operating Temperature: -55°C; Max Operating Temperature: 85°C; Tolerance: 20%; Voltage Rating (DC): 16V; Length: 600um; Width: 300um; Height: 390um; Thickness: 300um; ComponentLink1URL: https://datasheet.octopart.com/GRM033R61C105ME15D-Murata-datasheet-155345049.pdf?src-supplier=Newark; ComponentLink1Description: https://datasheet.octopart.com/GRM033R61C105ME15D-Murata-datasheet-155345049.pdf?src-supplier=Newark; ComponentLink2URL: https://datasheet.octopart.com/GRM033R61C105ME15D-Murata-datasheet-155345049.pdf?src-supplier=Element14; ComponentLink2Description: https://datasheet.octopart.com/GRM033R61C105ME15D-Murata-datasheet-155345049.pdf?src-supplier=Element14; ComponentLink3URL: https://datasheet.octopart.com/GRM033R61C105ME15D-Murata-datasheet-165579666.pdf?src-supplier=TME; ComponentLink3Description: https://datasheet.octopart.com/GRM033R61C105ME15D-Murata-datasheet-165579666.pdf?src-supplier=TME; Supplier Part Number 1: 490-18654-1-ND; Dielectric: X5R
footprint CAP_0201_CAPC0603X03N (Chip Capacitor, 2-Leads, Body 0.60x0.30mm, IPC Medium Density)
pins: 1, 2

## CAP_1UF_16V_X5R_0603
designator C?, comment Voltage Rating: 16V  Capacitance: 1uF  Case/Package: 0603  (hidden comment: CL10A105KO8NNNC)
CAP CER 1UF 16V X5R 0603; Manufacturer: Samsung; Material: Ceramic; Tolerance: 10%; Manufacturer Part Number: CL10A105KO8NNNC; RoHS: Yes; Category: Ceramic Capacitors; Stock 1: 252255; Pricing 1: 1=0.10000, 10=0.03300, 50=0.01800, 100=0.01470, 500=0.01050, 1000=0.00825 (USD); Mount: Surface Mount; Case Code (Metric): 1608; Case Code (Imperial): 0603; Contact Plating: Tin; Min Operating Temperature: -55°C; Max Operating Temperature: 85°C; Package Quantity: 1; Packaging: Tape and Reel; Dielectric: X5R; Voltage Rating (DC): 16V; Series: CL; Voltage: 16V; Construction: Flat; Length: 1.6mm; Width: 0.031inch; Height: 0.8mm; Thickness: 0.035inch; Depth: 0.8mm; Radiation Hardening: No; Lead Free: Lead Free; RoHS Compliant: Yes; ComponentLink1URL: https://datasheet.ciiva.com/16199/cl10a105ko8nnnc-16199033.pdf?src-supplier=Future+Electronics; ComponentLink1Description: https://datasheet.ciiva.com/16199/cl10a105ko8nnnc-16199033.pdf?src-supplier=Future+Electronics; ComponentLink2URL: https://datasheet.ciiva.com/15195/getdatasheetpartid-359688-15195706.pdf?src-supplier=Verical; ComponentLink2Description: https://datasheet.ciiva.com/15195/getdatasheetpartid-359688-15195706.pdf?src-supplier=Verical; ComponentLink3URL: https://datasheet.ciiva.com/29198/458190-da-01-en-vs-kondensator-0603-29198480.pdf?src-supplier=Conrad; ComponentLink3Description: https://datasheet.ciiva.com/29198/458190-da-01-en-vs-kondensator-0603-29198480.pdf?src-supplier=Conrad; Supplier 1: Digi-Key; Supplier 2: Mouser; Supplier 3: Newark; Supplier Part Number 1: 1276-1034-1-ND; Supplier Part Number 2: 187-CL10A105KO8NNNC; Supplier Part Number 3: 82AC9279
footprint CAP_0603_CAPC1608X08N (Chip Capacitor, 2-Leads, Body 1.60x0.80mm, IPC Medium Density)
pins: 1, 2
